# Altium footprint library ref-packages-longpad.PCBLIB: 1527 footprints (part 42 of 103)
Each footprint in its own frame and in the unit in brackets; x right, y up, seen from the top. Pads: shape width x height; smd on the part's side, far side on the other; paste and mask are expansions set on the pad; w line width, h text height; cw(c..) or ccw(c..) is an arc to the next point about the centre after c.
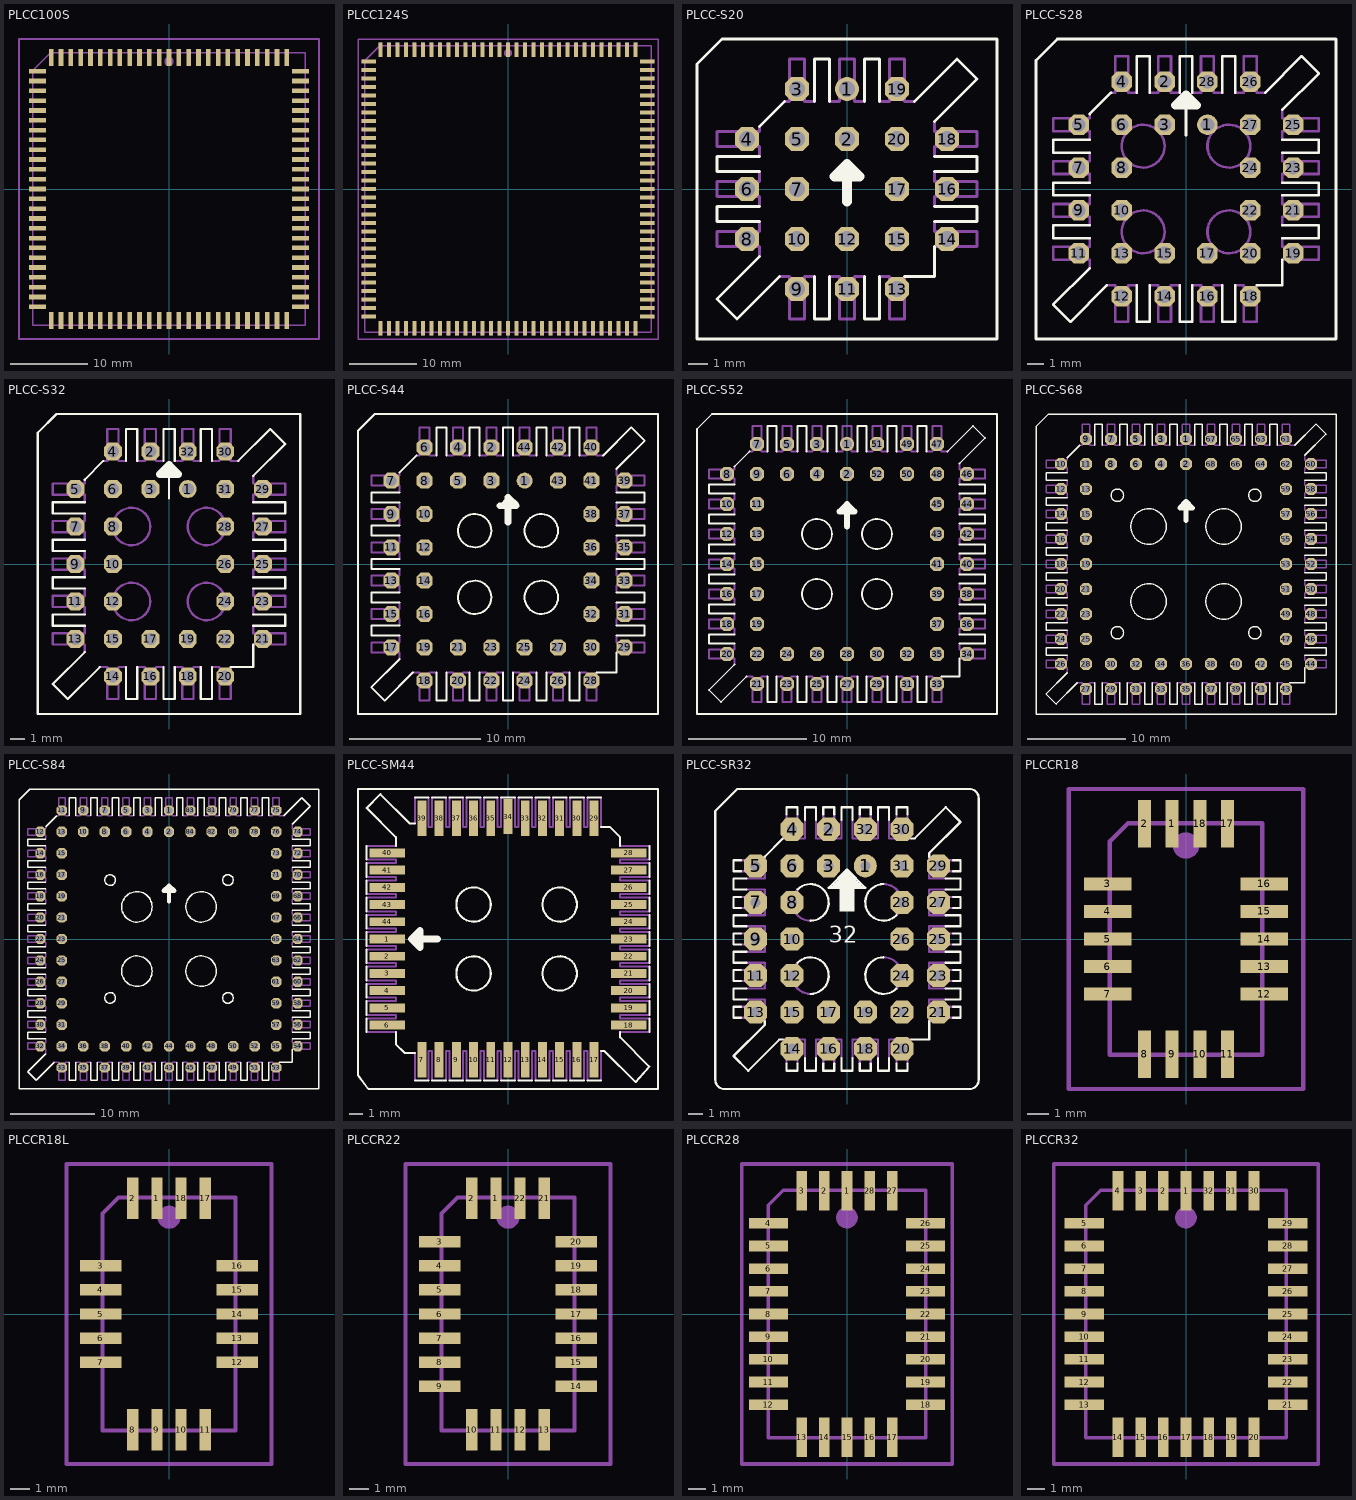
[diagram p41: the footprints below, top view; thin cyan lines are the x and y axes]

## PLCC100S [mil]
pads (100):
  rect 23.62x86.61 smd: 1(0,669.29) 2(-50,669.29) 3(-100,669.29) 4(-150,669.29) 5(-200,669.29) 6(-250,669.29) 7(-300,669.29) 8(-350,669.29) 9(-400,669.29) 10(-450,669.29) 11(-500,669.29) 12(-550,669.29) 13(-600,669.29) 39(-600,-669.29) 40(-550,-669.29) 41(-500,-669.29) 42(-450,-669.29) 43(-400,-669.29) 44(-350,-669.29) 45(-300,-669.29) 46(-250,-669.29) 47(-200,-669.29) 48(-150,-669.29) 49(-100,-669.29) 50(-50,-669.29) 51(0,-669.29) 52(50,-669.29) 53(100,-669.29) 54(150,-669.29) 55(200,-669.29) 56(250,-669.29) 57(300,-669.29) 58(350,-669.29) 59(400,-669.29) 60(450,-669.29) 61(500,-669.29) 62(550,-669.29) 63(600,-669.29) 89(600,669.29) 90(550,669.29) 91(500,669.29) 92(450,669.29) 93(400,669.29) 94(350,669.29) 95(300,669.29) 96(250,669.29) 97(200,669.29) 98(150,669.29) 99(100,669.29) 100(50,669.29)
  rect 86.61x23.62 smd: 14(-669.29,600) 15(-669.29,550) 16(-669.29,500) 17(-669.29,450) 18(-669.29,400) 19(-669.29,350) 20(-669.29,300) 21(-669.29,250) 22(-669.29,200) 23(-669.29,150) 24(-669.29,100) 25(-669.29,50) 26(-669.29,0) 27(-669.29,-50) 28(-669.29,-100) 29(-669.29,-150) 30(-669.29,-200) 31(-669.29,-250) 32(-669.29,-300) 33(-669.29,-350) 34(-669.29,-400) 35(-669.29,-450) 36(-669.29,-500) 37(-669.29,-550) 38(-669.29,-600) 64(669.29,-600) 65(669.29,-550) 66(669.29,-500) 67(669.29,-450) 68(669.29,-400) 69(669.29,-350) 70(669.29,-300) 71(669.29,-250) 72(669.29,-200) 73(669.29,-150) 74(669.29,-100) 75(669.29,-50) 76(669.29,0) 77(669.29,50) 78(669.29,100) 79(669.29,150) 80(669.29,200) 81(669.29,250) 82(669.29,300) 83(669.29,350) 84(669.29,400) 85(669.29,450) 86(669.29,500) 87(669.29,550) 88(669.29,600)
Mechanical 16:
  circle w24: c0,649.61 r11.81
  rectangle: -10.24,694.88 10.24,712.6
  rectangle: -60.24,694.88 -39.76,712.6
  rectangle: -110.24,694.88 -89.76,712.6
  rectangle: -160.24,694.88 -139.76,712.6
  rectangle: -210.24,694.88 -189.76,712.6
  rectangle: -260.24,694.88 -239.76,712.6
  rectangle: -310.24,694.88 -289.76,712.6
  rectangle: -360.24,694.88 -339.76,712.6
  rectangle: -410.24,694.88 -389.76,712.6
  rectangle: -460.24,694.88 -439.76,712.6
  rectangle: -510.24,694.88 -489.76,712.6
  rectangle: -560.24,694.88 -539.76,712.6
  rectangle: -610.24,694.88 -589.76,712.6
  rectangle: -712.6,589.76 -694.88,610.24
  rectangle: -712.6,539.76 -694.88,560.24
  rectangle: -712.6,489.76 -694.88,510.24
  rectangle: -712.6,439.76 -694.88,460.24
  rectangle: -712.6,389.76 -694.88,410.24
  rectangle: -712.6,339.76 -694.88,360.24
  rectangle: -712.6,289.76 -694.88,310.24
  rectangle: -712.6,239.76 -694.88,260.24
  rectangle: -712.6,189.76 -694.88,210.24
  rectangle: -712.6,139.76 -694.88,160.24
  rectangle: -712.6,89.76 -694.88,110.24
  rectangle: -712.6,39.76 -694.88,60.24
  rectangle: -712.6,-10.24 -694.88,10.24
  rectangle: -712.6,-60.24 -694.88,-39.76
  rectangle: -712.6,-110.24 -694.88,-89.76
  rectangle: -712.6,-160.24 -694.88,-139.76
  rectangle: -712.6,-210.24 -694.88,-189.76
  rectangle: -712.6,-260.24 -694.88,-239.76
  rectangle: -712.6,-310.24 -694.88,-289.76
  rectangle: -712.6,-360.24 -694.88,-339.76
  rectangle: -712.6,-410.24 -694.88,-389.76
  rectangle: -712.6,-460.24 -694.88,-439.76
  rectangle: -712.6,-510.24 -694.88,-489.76
  rectangle: -712.6,-560.24 -694.88,-539.76
  rectangle: -712.6,-610.24 -694.88,-589.76
  rectangle: -610.24,-712.6 -589.76,-694.88
  rectangle: -560.24,-712.6 -539.76,-694.88
  rectangle: -510.24,-712.6 -489.76,-694.88
  rectangle: -460.24,-712.6 -439.76,-694.88
  rectangle: -410.24,-712.6 -389.76,-694.88
  rectangle: -360.24,-712.6 -339.76,-694.88
  rectangle: -310.24,-712.6 -289.76,-694.88
  rectangle: -260.24,-712.6 -239.76,-694.88
  rectangle: -210.24,-712.6 -189.76,-694.88
  rectangle: -160.24,-712.6 -139.76,-694.88
  rectangle: -110.24,-712.6 -89.76,-694.88
  rectangle: -60.24,-712.6 -39.76,-694.88
  rectangle: -10.24,-712.6 10.24,-694.88
  rectangle: 39.76,-712.6 60.24,-694.88
  rectangle: 89.76,-712.6 110.24,-694.88
  rectangle: 139.76,-712.6 160.24,-694.88
  rectangle: 189.76,-712.6 210.24,-694.88
  rectangle: 239.76,-712.6 260.24,-694.88
  rectangle: 289.76,-712.6 310.24,-694.88
  rectangle: 339.76,-712.6 360.24,-694.88
  rectangle: 389.76,-712.6 410.24,-694.88
  rectangle: 439.76,-712.6 460.24,-694.88
  rectangle: 489.76,-712.6 510.24,-694.88
  rectangle: 539.76,-712.6 560.24,-694.88
  rectangle: 589.76,-712.6 610.24,-694.88
  rectangle: 694.88,-610.24 712.6,-589.76
  rectangle: 694.88,-560.24 712.6,-539.76
  rectangle: 694.88,-510.24 712.6,-489.76
  rectangle: 694.88,-460.24 712.6,-439.76
  rectangle: 694.88,-410.24 712.6,-389.76
  rectangle: 694.88,-360.24 712.6,-339.76
  rectangle: 694.88,-310.24 712.6,-289.76
  rectangle: 694.88,-260.24 712.6,-239.76
  rectangle: 694.88,-210.24 712.6,-189.76
  rectangle: 694.88,-160.24 712.6,-139.76
  rectangle: 694.88,-110.24 712.6,-89.76
  rectangle: 694.88,-60.24 712.6,-39.76
  rectangle: 694.88,-10.24 712.6,10.24
  rectangle: 694.88,39.76 712.6,60.24
  rectangle: 694.88,89.76 712.6,110.24
  rectangle: 694.88,139.76 712.6,160.24
  rectangle: 694.88,189.76 712.6,210.24
  rectangle: 694.88,239.76 712.6,260.24
  rectangle: 694.88,289.76 712.6,310.24
  rectangle: 694.88,339.76 712.6,360.24
  rectangle: 694.88,389.76 712.6,410.24
  rectangle: 694.88,439.76 712.6,460.24
  rectangle: 694.88,489.76 712.6,510.24
  rectangle: 694.88,539.76 712.6,560.24
  rectangle: 694.88,589.76 712.6,610.24
  rectangle: 589.76,694.88 610.24,712.6
  rectangle: 539.76,694.88 560.24,712.6
  rectangle: 489.76,694.88 510.24,712.6
  rectangle: 439.76,694.88 460.24,712.6
  rectangle: 389.76,694.88 410.24,712.6
  rectangle: 339.76,694.88 360.24,712.6
  rectangle: 289.76,694.88 310.24,712.6
  rectangle: 239.76,694.88 260.24,712.6
  rectangle: 189.76,694.88 210.24,712.6
  rectangle: 139.76,694.88 160.24,712.6
  rectangle: 89.76,694.88 110.24,712.6
  rectangle: 39.76,694.88 60.24,712.6
  lines w8: -692.91,-692.91 -692.91,604.92 -604.92,692.91 692.91,692.91 692.91,-692.91 -692.91,-692.91
Mechanical 27:
  lines w7.87: -763.9,-763.9 763.9,-763.9 763.9,763.9 -763.9,763.9 -763.9,-763.9

## PLCC124S [mil]
pads (124):
  rect 23.62x86.61 smd: 1(0,818.9) 2(-50,818.9) 3(-100,818.9) 4(-150,818.9) 5(-200,818.9) 6(-250,818.9) 7(-300,818.9) 8(-350,818.9) 9(-400,818.9) 10(-450,818.9) 11(-500,818.9) 12(-550,818.9) 13(-600,818.9) 14(-650,818.9) 15(-700,818.9) 16(-750,818.9) 48(-750,-818.9) 49(-700,-818.9) 50(-650,-818.9) 51(-600,-818.9) 52(-550,-818.9) 53(-500,-818.9) 54(-450,-818.9) 55(-400,-818.9) 56(-350,-818.9) 57(-300,-818.9) 58(-250,-818.9) 59(-200,-818.9) 60(-150,-818.9) 61(-100,-818.9) 62(-50,-818.9) 63(0,-818.9) 64(50,-818.9) 65(100,-818.9) 66(150,-818.9) 67(200,-818.9) 68(250,-818.9) 69(300,-818.9) 70(350,-818.9) 71(400,-818.9) 72(450,-818.9) 73(500,-818.9) 74(550,-818.9) 75(600,-818.9) 76(650,-818.9) 77(700,-818.9) 78(750,-818.9) 110(750,818.9) 111(700,818.9) 112(650,818.9) 113(600,818.9) 114(550,818.9) 115(500,818.9) 116(450,818.9) 117(400,818.9) 118(350,818.9) 119(300,818.9) 120(250,818.9) 121(200,818.9) 122(150,818.9) 123(100,818.9) 124(50,818.9)
  rect 86.61x23.62 smd: 17(-818.9,750) 18(-818.9,700) 19(-818.9,650) 20(-818.9,600) 21(-818.9,550) 22(-818.9,500) 23(-818.9,450) 24(-818.9,400) 25(-818.9,350) 26(-818.9,300) 27(-818.9,250) 28(-818.9,200) 29(-818.9,150) 30(-818.9,100) 31(-818.9,50) 32(-818.9,0) 33(-818.9,-50) 34(-818.9,-100) 35(-818.9,-150) 36(-818.9,-200) 37(-818.9,-250) 38(-818.9,-300) 39(-818.9,-350) 40(-818.9,-400) 41(-818.9,-450) 42(-818.9,-500) 43(-818.9,-550) 44(-818.9,-600) 45(-818.9,-650) 46(-818.9,-700) 47(-818.9,-750) 79(818.9,-750) 80(818.9,-700) 81(818.9,-650) 82(818.9,-600) 83(818.9,-550) 84(818.9,-500) 85(818.9,-450) 86(818.9,-400) 87(818.9,-350) 88(818.9,-300) 89(818.9,-250) 90(818.9,-200) 91(818.9,-150) 92(818.9,-100) 93(818.9,-50) 94(818.9,0) 95(818.9,50) 96(818.9,100) 97(818.9,150) 98(818.9,200) 99(818.9,250) 100(818.9,300) 101(818.9,350) 102(818.9,400) 103(818.9,450) 104(818.9,500) 105(818.9,550) 106(818.9,600) 107(818.9,650) 108(818.9,700) 109(818.9,750)
Mechanical 16:
  circle w24: c0,799.21 r11.81
  rectangle: -10.24,844.49 10.24,862.2
  rectangle: -60.24,844.49 -39.76,862.2
  rectangle: -110.24,844.49 -89.76,862.2
  rectangle: -160.24,844.49 -139.76,862.2
  rectangle: -210.24,844.49 -189.76,862.2
  rectangle: -260.24,844.49 -239.76,862.2
  rectangle: -310.24,844.49 -289.76,862.2
  rectangle: -360.24,844.49 -339.76,862.2
  rectangle: -410.24,844.49 -389.76,862.2
  rectangle: -460.24,844.49 -439.76,862.2
  rectangle: -510.24,844.49 -489.76,862.2
  rectangle: -560.24,844.49 -539.76,862.2
  rectangle: -610.24,844.49 -589.76,862.2
  rectangle: -660.24,844.49 -639.76,862.2
  rectangle: -710.24,844.49 -689.76,862.2
  rectangle: -760.24,844.49 -739.76,862.2
  rectangle: -862.2,739.76 -844.49,760.24
  rectangle: -862.2,689.76 -844.49,710.24
  rectangle: -862.2,639.76 -844.49,660.24
  rectangle: -862.2,589.76 -844.49,610.24
  rectangle: -862.2,539.76 -844.49,560.24
  rectangle: -862.2,489.76 -844.49,510.24
  rectangle: -862.2,439.76 -844.49,460.24
  rectangle: -862.2,389.76 -844.49,410.24
  rectangle: -862.2,339.76 -844.49,360.24
  rectangle: -862.2,289.76 -844.49,310.24
  rectangle: -862.2,239.76 -844.49,260.24
  rectangle: -862.2,189.76 -844.49,210.24
  rectangle: -862.2,139.76 -844.49,160.24
  rectangle: -862.2,89.76 -844.49,110.24
  rectangle: -862.2,39.76 -844.49,60.24
  rectangle: -862.2,-10.24 -844.49,10.24
  rectangle: -862.2,-60.24 -844.49,-39.76
  rectangle: -862.2,-110.24 -844.49,-89.76
  rectangle: -862.2,-160.24 -844.49,-139.76
  rectangle: -862.2,-210.24 -844.49,-189.76
  rectangle: -862.2,-260.24 -844.49,-239.76
  rectangle: -862.2,-310.24 -844.49,-289.76
  rectangle: -862.2,-360.24 -844.49,-339.76
  rectangle: -862.2,-410.24 -844.49,-389.76
  rectangle: -862.2,-460.24 -844.49,-439.76
  rectangle: -862.2,-510.24 -844.49,-489.76
  rectangle: -862.2,-560.24 -844.49,-539.76
  rectangle: -862.2,-610.24 -844.49,-589.76
  rectangle: -862.2,-660.24 -844.49,-639.76
  rectangle: -862.2,-710.24 -844.49,-689.76
  rectangle: -862.2,-760.24 -844.49,-739.76
  rectangle: -760.24,-862.2 -739.76,-844.49
  rectangle: -710.24,-862.2 -689.76,-844.49
  rectangle: -660.24,-862.2 -639.76,-844.49
  rectangle: -610.24,-862.2 -589.76,-844.49
  rectangle: -560.24,-862.2 -539.76,-844.49
  rectangle: -510.24,-862.2 -489.76,-844.49
  rectangle: -460.24,-862.2 -439.76,-844.49
  rectangle: -410.24,-862.2 -389.76,-844.49
  rectangle: -360.24,-862.2 -339.76,-844.49
  rectangle: -310.24,-862.2 -289.76,-844.49
  rectangle: -260.24,-862.2 -239.76,-844.49
  rectangle: -210.24,-862.2 -189.76,-844.49
  rectangle: -160.24,-862.2 -139.76,-844.49
  rectangle: -110.24,-862.2 -89.76,-844.49
  rectangle: -60.24,-862.2 -39.76,-844.49
  rectangle: -10.24,-862.2 10.24,-844.49
  rectangle: 39.76,-862.2 60.24,-844.49
  rectangle: 89.76,-862.2 110.24,-844.49
  rectangle: 139.76,-862.2 160.24,-844.49
  rectangle: 189.76,-862.2 210.24,-844.49
  rectangle: 239.76,-862.2 260.24,-844.49
  rectangle: 289.76,-862.2 310.24,-844.49
  rectangle: 339.76,-862.2 360.24,-844.49
  rectangle: 389.76,-862.2 410.24,-844.49
  rectangle: 439.76,-862.2 460.24,-844.49
  rectangle: 489.76,-862.2 510.24,-844.49
  rectangle: 539.76,-862.2 560.24,-844.49
  rectangle: 589.76,-862.2 610.24,-844.49
  rectangle: 639.76,-862.2 660.24,-844.49
  rectangle: 689.76,-862.2 710.24,-844.49
  rectangle: 739.76,-862.2 760.24,-844.49
  rectangle: 844.49,-760.24 862.2,-739.76
  rectangle: 844.49,-710.24 862.2,-689.76
  rectangle: 844.49,-660.24 862.2,-639.76
  rectangle: 844.49,-610.24 862.2,-589.76
  rectangle: 844.49,-560.24 862.2,-539.76
  rectangle: 844.49,-510.24 862.2,-489.76
  rectangle: 844.49,-460.24 862.2,-439.76
  rectangle: 844.49,-410.24 862.2,-389.76
  rectangle: 844.49,-360.24 862.2,-339.76
  rectangle: 844.49,-310.24 862.2,-289.76
  rectangle: 844.49,-260.24 862.2,-239.76
  rectangle: 844.49,-210.24 862.2,-189.76
  rectangle: 844.49,-160.24 862.2,-139.76
  rectangle: 844.49,-110.24 862.2,-89.76
  rectangle: 844.49,-60.24 862.2,-39.76
  rectangle: 844.49,-10.24 862.2,10.24
  rectangle: 844.49,39.76 862.2,60.24
  rectangle: 844.49,89.76 862.2,110.24
  rectangle: 844.49,139.76 862.2,160.24
  rectangle: 844.49,189.76 862.2,210.24
  rectangle: 844.49,239.76 862.2,260.24
  rectangle: 844.49,289.76 862.2,310.24
  rectangle: 844.49,339.76 862.2,360.24
  rectangle: 844.49,389.76 862.2,410.24
  rectangle: 844.49,439.76 862.2,460.24
  rectangle: 844.49,489.76 862.2,510.24
  rectangle: 844.49,539.76 862.2,560.24
  rectangle: 844.49,589.76 862.2,610.24
  rectangle: 844.49,639.76 862.2,660.24
  rectangle: 844.49,689.76 862.2,710.24
  rectangle: 844.49,739.76 862.2,760.24
  rectangle: 739.76,844.49 760.24,862.2
  rectangle: 689.76,844.49 710.24,862.2
  rectangle: 639.76,844.49 660.24,862.2
  rectangle: 589.76,844.49 610.24,862.2
  rectangle: 539.76,844.49 560.24,862.2
  rectangle: 489.76,844.49 510.24,862.2
  rectangle: 439.76,844.49 460.24,862.2
  rectangle: 389.76,844.49 410.24,862.2
  rectangle: 339.76,844.49 360.24,862.2
  rectangle: 289.76,844.49 310.24,862.2
  rectangle: 239.76,844.49 260.24,862.2
  rectangle: 189.76,844.49 210.24,862.2
  rectangle: 139.76,844.49 160.24,862.2
  rectangle: 89.76,844.49 110.24,862.2
  rectangle: 39.76,844.49 60.24,862.2
  lines w8: -842.52,-842.52 -842.52,754.53 -754.53,842.52 842.52,842.52 842.52,-842.52 -842.52,-842.52
Mechanical 27:
  lines w7.87: -882.01,-882.01 882.01,-882.01 882.01,882.01 -882.01,882.01 -882.01,-882.01

## PLCC-S20 [mil]
pads (20):
  round 48 hole 32: 1(0,200)
  oct 48x48 hole 32: 2(0,100) 3(-100,200) 4(-200,100) 5(-100,100) 6(-200,0) 7(-100,0) 8(-200,-100) 9(-100,-200) 10(-100,-100) 11(0,-200) 12(0,-100) 13(100,-200) 14(200,-100) 15(100,-100) 16(200,0) 17(100,0) 18(200,100) 19(100,200) 20(100,100)
Top Overlay:
  lines w6: -175,-135 -260,-220 -220,-260 -135,-175 ; -175,-65 -260,-65 -260,-35 -175,-35 ; -175,35 -260,35 -260,65 -175,65 ; -175,125 -125,175 ; -65,-175 -65,-260 -35,-260 -35,-175 ; -65,175 -65,260 -35,260 -35,175 ; 35,-175 35,-260 65,-260 65,-175 ; 35,175 35,260 65,260 65,175 ; 115,-175 175,-175 175,-115 ; 135,175 220,260 260,220 175,135 ; 175,-65 260,-65 260,-35 175,-35 ; 175,35 260,35 260,65 175,65 ; -300,-300 -300,250 -250,300 300,300 300,-300 -300,-300
  lines w20: 0,-25 0,50 ; 0,50 25,25 -25,25 0,50
Mechanical 16:
  lines w6: -175,-135 -175,-115 -260,-115 -260,-85 -175,-85 -175,-65 ; -175,-35 -175,-15 -260,-15 -260,15 -175,15 -175,35 ; -175,65 -175,85 -260,85 -260,115 -175,115 -175,125 ; -135,-175 -115,-175 -115,-260 -85,-260 -85,-175 -65,-175 ; -125,175 -115,175 -115,260 -85,260 -85,175 -65,175 ; -35,-175 -15,-175 -15,-260 15,-260 15,-175 35,-175 ; -35,175 -15,175 -15,260 15,260 15,175 35,175 ; 65,-175 85,-175 85,-260 115,-260 115,-175 ; 65,175 85,175 85,260 115,260 115,175 135,175 ; 175,-115 260,-115 260,-85 175,-85 175,-65 ; 175,-35 175,-15 260,-15 260,15 175,15 175,35 ; 175,65 175,85 260,85 260,115 175,115 175,135

## PLCC-S28 [mil]
pads (28):
  round 48 hole 32: 1(50,150)
  oct 48x48 hole 32: 2(-50,250) 3(-50,150) 4(-150,250) 5(-250,150) 6(-150,150) 7(-250,50) 8(-150,50) 9(-250,-50) 10(-150,-50) 11(-250,-150) 12(-150,-250) 13(-150,-150) 14(-50,-250) 15(-50,-150) 16(50,-250) 17(50,-150) 18(150,-250) 19(250,-150) 20(150,-150) 21(250,-50) 22(150,-50) 23(250,50) 24(150,50) 25(250,150) 26(150,250) 27(150,150) 28(50,250)
Top Overlay:
  lines w6: -225,-185 -310,-270 -270,-310 -185,-225 ; -225,-115 -310,-115 -310,-85 -225,-85 ; -225,-15 -310,-15 -310,15 -225,15 ; -225,85 -310,85 -310,115 -225,115 ; -225,175 -175,225 ; -115,-225 -115,-310 -85,-310 -85,-225 ; -115,225 -115,310 -85,310 -85,225 ; -15,-225 -15,-310 15,-310 15,-225 ; -15,225 -15,310 15,310 15,225 ; 0,125 0,220 ; 85,-225 85,-310 115,-310 115,-225 ; 85,225 85,310 115,310 115,225 ; 165,-225 225,-225 225,-165 ; 185,225 270,310 310,270 225,185 ; 225,-115 310,-115 310,-85 225,-85 ; 225,-15 310,-15 310,15 225,15 ; 225,85 310,85 310,115 225,115 ; -350,-350 -350,300 -300,350 350,350 350,-350 -350,-350
  lines w20: -25,195 25,195 0,220 -25,195
Mechanical 16:
  circle w6: c-100,100 r50
  circle w6: c100,100 r50
  circle w6: c-100,-100 r50
  circle w6: c100,-100 r50
  lines w6: -225,-185 -225,-165 -310,-165 -310,-135 -225,-135 -225,-115 ; -225,-85 -225,-65 -310,-65 -310,-35 -225,-35 -225,-15 ; -225,15 -225,35 -310,35 -310,65 -225,65 -225,85 ; -225,115 -225,135 -310,135 -310,165 -225,165 -225,175 ; -185,-225 -165,-225 -165,-310 -135,-310 -135,-225 -115,-225 ; -175,225 -165,225 -165,310 -135,310 -135,225 -115,225 ; -85,-225 -65,-225 -65,-310 -35,-310 -35,-225 -15,-225 ; -85,225 -65,225 -65,310 -35,310 -35,225 -15,225 ; 15,-225 35,-225 35,-310 65,-310 65,-225 85,-225 ; 15,225 35,225 35,310 65,310 65,225 85,225 ; 115,-225 135,-225 135,-310 165,-310 165,-225 ; 115,225 135,225 135,310 165,310 165,225 185,225 ; 225,-165 310,-165 310,-135 225,-135 225,-115 ; 225,-85 225,-65 310,-65 310,-35 225,-35 225,-15 ; 225,15 225,35 310,35 310,65 225,65 225,85 ; 225,115 225,135 310,135 310,165 225,165 225,185

## PLCC-S32 [mil]
pads (32):
  round 48 hole 32: 1(50,200)
  oct 48x48 hole 32: 2(-50,300) 3(-50,200) 4(-150,300) 5(-250,200) 6(-150,200) 7(-250,100) 8(-150,100) 9(-250,0) 10(-150,0) 11(-250,-100) 12(-150,-100) 13(-250,-200) 14(-150,-300) 15(-150,-200) 16(-50,-300) 17(-50,-200) 18(50,-300) 19(50,-200) 20(150,-300) 21(250,-200) 22(150,-200) 23(250,-100) 24(150,-100) 25(250,0) 26(150,0) 27(250,100) 28(150,100) 29(250,200) 30(150,300) 31(150,200) 32(50,300)
Top Overlay:
  lines w6: -225,-235 -310,-320 -270,-360 -185,-275 ; -225,-165 -310,-165 -310,-135 -225,-135 ; -225,-65 -310,-65 -310,-35 -225,-35 ; -225,35 -310,35 -310,65 -225,65 ; -225,135 -310,135 -310,165 -225,165 ; -225,225 -175,275 ; -115,-275 -115,-360 -85,-360 -85,-275 ; -115,275 -115,360 -85,360 -85,275 ; -15,-275 -15,-360 15,-360 15,-275 ; -15,275 -15,360 15,360 15,275 ; 0,175 0,265 ; 85,-275 85,-360 115,-360 115,-275 ; 85,275 85,360 115,360 115,275 ; 165,-275 225,-275 225,-215 ; 185,275 270,360 310,320 225,235 ; 225,-165 310,-165 310,-135 225,-135 ; 225,-65 310,-65 310,-35 225,-35 ; 225,35 310,35 310,65 225,65 ; 225,135 310,135 310,165 225,165 ; -350,-400 -350,350 -300,400 350,400 350,-400 -350,-400
  lines w20: -25,240 25,240 0,265 -25,240
Mechanical 16:
  circle w6: c-100,100 r50
  circle w6: c100,100 r50
  circle w6: c-100,-100 r50
  circle w6: c100,-100 r50
  lines w6: -225,-235 -225,-215 -310,-215 -310,-185 -225,-185 -225,-165 ; -225,-135 -225,-115 -310,-115 -310,-85 -225,-85 -225,-65 ; -225,-35 -225,-15 -310,-15 -310,15 -225,15 -225,35 ; -225,65 -225,85 -310,85 -310,115 -225,115 -225,135 ; -225,165 -225,185 -310,185 -310,215 -225,215 -225,225 ; -185,-275 -165,-275 -165,-360 -135,-360 -135,-275 -115,-275 ; -175,275 -165,275 -165,360 -135,360 -135,275 -115,275 ; -85,-275 -65,-275 -65,-360 -35,-360 -35,-275 -15,-275 ; -85,275 -65,275 -65,360 -35,360 -35,275 -15,275 ; 15,-275 35,-275 35,-360 65,-360 65,-275 85,-275 ; 15,275 35,275 35,360 65,360 65,275 85,275 ; 115,-275 135,-275 135,-360 165,-360 165,-275 ; 115,275 135,275 135,360 165,360 165,275 185,275 ; 225,-215 310,-215 310,-185 225,-185 225,-165 ; 225,-135 225,-115 310,-115 310,-85 225,-85 225,-65 ; 225,-35 225,-15 310,-15 310,15 225,15 225,35 ; 225,65 225,85 310,85 310,115 225,115 225,135 ; 225,165 225,185 310,185 310,215 225,215 225,235

## PLCC-S44 [mil]
pads (44):
  round 48 hole 32: 1(50,250)
  oct 48x48 hole 32: 2(-50,350) 3(-50,250) 4(-150,350) 5(-150,250) 6(-250,350) 7(-350,250) 8(-250,250) 9(-350,150) 10(-250,150) 11(-350,50) 12(-250,50) 13(-350,-50) 14(-250,-50) 15(-350,-150) 16(-250,-150) 17(-350,-250) 18(-250,-350) 19(-250,-250) 20(-150,-350) 21(-150,-250) 22(-50,-350) 23(-50,-250) 24(50,-350) 25(50,-250) 26(150,-350) 27(150,-250) 28(250,-350) 29(350,-250) 30(250,-250) 31(350,-150) 32(250,-150) 33(350,-50) 34(250,-50) 35(350,50) 36(250,50) 37(350,150) 38(250,150) 39(350,250) 40(250,350) 41(250,250) 42(150,350) 43(150,250) 44(50,350)
Top Overlay:
  circle w6: c-100,100 r50
  circle w6: c100,100 r50
  circle w6: c-100,-100 r50
  circle w6: c100,-100 r50
  lines w6: -325,-285 -410,-370 -370,-410 -285,-325 ; -325,-215 -410,-215 -410,-185 -325,-185 ; -325,-115 -410,-115 -410,-85 -325,-85 ; -325,-15 -410,-15 -410,15 -325,15 ; -325,85 -410,85 -410,115 -325,115 ; -325,185 -410,185 -410,215 -325,215 ; -325,275 -275,325 ; -215,-325 -215,-410 -185,-410 -185,-325 ; -215,325 -215,410 -185,410 -185,325 ; -115,-325 -115,-410 -85,-410 -85,-325 ; -115,325 -115,410 -85,410 -85,325 ; -25,175 0,200 ; -15,-325 -15,-410 15,-410 15,-325 ; -15,325 -15,410 15,410 15,325 ; 85,-325 85,-410 115,-410 115,-325 ; 85,325 85,410 115,410 115,325 ; 185,-325 185,-410 215,-410 215,-325 ; 185,325 185,410 215,410 215,325 ; 265,-325 325,-325 325,-265 ; 285,325 370,410 410,370 325,285 ; 325,-215 410,-215 410,-185 325,-185 ; 325,-115 410,-115 410,-85 325,-85 ; 325,-15 410,-15 410,15 325,15 ; 325,85 410,85 410,115 325,115 ; 325,185 410,185 410,215 325,215 ; -450,-450 -450,400 -400,450 450,450 450,-450 -450,-450
  lines w20: -25,175 25,175 0,200 0,125
Mechanical 16:
  lines w6: -325,-285 -325,-265 -410,-265 -410,-235 -325,-235 -325,-215 ; -325,-185 -325,-165 -410,-165 -410,-135 -325,-135 -325,-115 ; -325,-85 -325,-65 -410,-65 -410,-35 -325,-35 -325,-15 ; -325,15 -325,35 -410,35 -410,65 -325,65 -325,85 ; -325,115 -325,135 -410,135 -410,165 -325,165 -325,185 ; -325,215 -325,235 -410,235 -410,265 -325,265 -325,275 ; -285,-325 -265,-325 -265,-410 -235,-410 -235,-325 -215,-325 ; -275,325 -265,325 -265,410 -235,410 -235,325 -215,325 ; -185,-325 -165,-325 -165,-410 -135,-410 -135,-325 -115,-325 ; -185,325 -165,325 -165,410 -135,410 -135,325 -115,325 ; -85,-325 -65,-325 -65,-410 -35,-410 -35,-325 -15,-325 ; -85,325 -65,325 -65,410 -35,410 -35,325 -15,325 ; 15,-325 35,-325 35,-410 65,-410 65,-325 85,-325 ; 15,325 35,325 35,410 65,410 65,325 85,325 ; 115,-325 135,-325 135,-410 165,-410 165,-325 185,-325 ; 115,325 135,325 135,410 165,410 165,325 185,325 ; 215,-325 235,-325 235,-410 265,-410 265,-325 ; 215,325 235,325 235,410 265,410 265,325 285,325 ; 325,-265 410,-265 410,-235 325,-235 325,-215 ; 325,-185 325,-165 410,-165 410,-135 325,-135 325,-115 ; 325,-85 325,-65 410,-65 410,-35 325,-35 325,-15 ; 325,15 325,35 410,35 410,65 325,65 325,85 ; 325,115 325,135 410,135 410,165 325,165 325,185 ; 325,215 325,235 410,235 410,265 325,265 325,285